# Altium integrated library My_LIB.IntLib: 372 symbols (part 3 of 3)
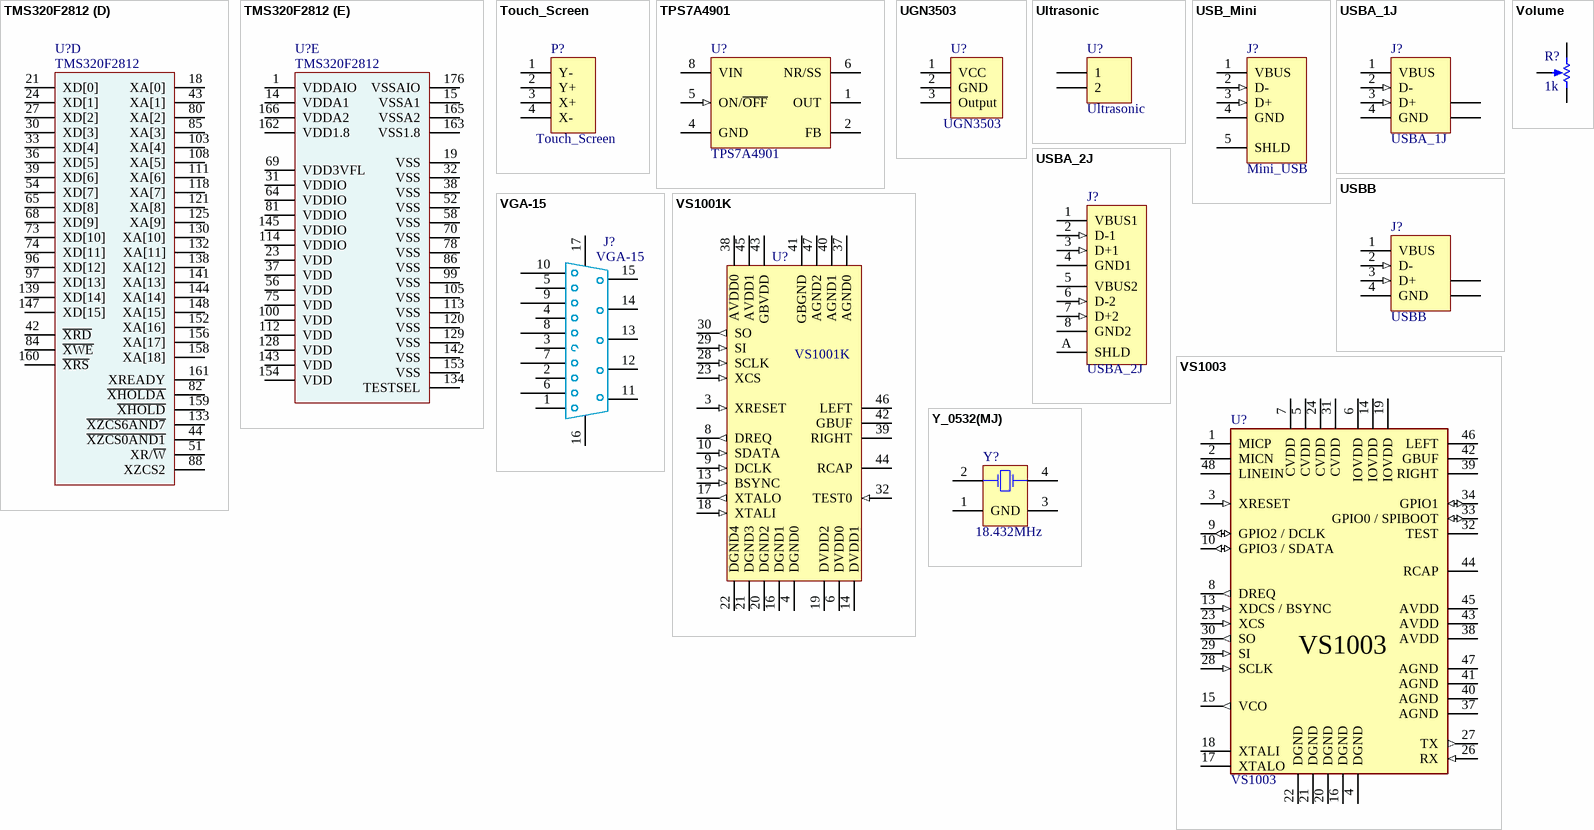
[diagram p15: symbols TMS320F2812 to Y_0532(MJ)]

## TMS320F2812
designator U?
footprint LQFP176_M (Thin QFP, 176-Leads, Body 24x24mm, Pitch 0.5mm, IPC Low Density)
footprint LQFP176_N (Thin QFP, 176-Leads, Body 24x24mm, Pitch 0.5mm, IPC Medium Density)
footprint LQFP176_L (Thin QFP, 176-Leads, Body 24x24mm, Pitch 0.5mm, IPC High Density)
part A pins: 2 ADCINB0, 3 ADCINB1, 4 ADCINB2, 5 ADCINB3, 6 ADCINB4, 7 ADCINB5, 8 ADCINB6, 9 ADCINB7, 10 ADCREFM, 11 ADCREFP, 12 AVSSREFBG, 13 AVDDREFBG, 16 ADCRESEXT, 17 XMP/~{MC}, 66 NC (TEST2), 67 NC (TEST1), 76 X2, 77 X1/XCLKIN, 119 XCLKOUT, 126 TMS, 127 TDO, 131 TDI, 135 ~{TRST}, 136 TCK, 137 EMU0, 146 EMU1, 164 ADCBGREFIN, 167 ADCINA7, 168 ADCINA6, 169 ADCINA5, 170 ADCINA4, 171 ADCINA3, 172 ADCINA2, 173 ADCINA1, 174 ADCINA0, 175 ADCLO
part B pins: 45 GPIOB0/PWM7, 46 GPIOB1/PWM8, 47 GPIOB2/PWM9, 48 GPIOB3/PWM10, 49 GPIOB4/PWM11, 50 GPIOB5/PWM12, 53 GPIOB6/T3PWM_T3CMP, 55 GPIOB7/T4PWM_T4CMP, 57 GPIOB8/CAP4_QEP3, 59 GPIOB9/CAP5_QEP4, 60 GPIOB10/CAP6_QEPI2, 61 GPIOB13/~{C4TRIP}, 62 GPIOB14/~{C5TRIP}, 63 GPIOB15/~{C6TRIP}, 71 GPIOB11/TDIRB, 72 GPIOB12/TCLKINB, 92 GPIOA0/PWM1, 93 GPIOA1/PWM2, 94 GPIOA2/PWM3, 95 GPIOA3/PWM4, 98 GPIOA4/PWM5, 101 GPIOA5/PWM6, 102 GPIOA6/T1PWM_T1CMP, 104 GPIOA7/T2PWM_T2CMP, 106 GPIOA8/CAP1_QEP1, 107 GPIOA9/CAP1_QEP2, 109 GPIOA10/CAP3_QEPI1, 116 GPIOA11/TDIRA, 117 GPIOA12/TCLKINA, 122 GPIOA13/~{C1TRIP}, 123 GPIOA14/~{C2TRIP}, 124 GPIOA15/~{C3TRIP}
part C pins: 20 GPIOF13/MDRA, 22 GPIOF12/MDXA, 25 GPIOF9/MCLKRA, 26 GPIOF10/MFSXA, 28 GPIOF8/MCLKXA, 29 GPIOF11/MFSRA, 34 GPIOF2/SPICLKA, 35 GPIOF3/SPISTEA, 40 GPIOF0/SPISIMOA, 41 GPIOF1/SPISOMIA, 79 GPIOD5/~{T3CTRIP_PDPINTB}, 83 GPIOD6/~{T4CTRIP/EVBSOC}, 87 GPIOF6/CANTXA, 89 GPIOF7/CANRXA, 90 GPIOG4/SCITXDB, 91 GPIOG5/SCIRXDB, 110 GPIOD0/~{T1CTRIP_PDPINTA}, 115 GPIOD1/~{T2CTRIP}/~{EVASOC}, 140 GPIOF14/XF_~{XPLLDIS}, 149 GPIOE0/XINT1_XBIO, 150 GPIOE2/XNMI_XINT13, 151 GPIOE1/XINT2_ADCSOC, 155 GPIOF4/SCITXDA, 157 GPIOF5/SCIRXDA
part D pins: 18 XA[0], 21 XD[0], 24 XD[1], 27 XD[2], 30 XD[3], 33 XD[4], 36 XD[5], 39 XD[6], 42 ~{XRD}, 43 XA[1], 44 ~{XZCS0AND1}, 51 XR/~{W}, 54 XD[7], 65 XD[8], 68 XD[9], 73 XD[10], 74 XD[11], 80 XA[2], 82 ~{XHOLDA}, 84 ~{XWE}, 85 XA[3], 88 XZCS2, 96 XD[12], 97 XD[13], 103 XA[4], 108 XA[5], 111 XA[6], 118 XA[7], 121 XA[8], 125 XA[9], 130 XA[10], 132 XA[11], 133 ~{XZCS6AND7}, 138 XA[12], 139 XD[14], 141 XA[13], 144 XA[14], 147 XD[15], 148 XA[15], 152 XA[16], 156 XA[17], 158 XA[18], 159 ~{XHOLD}, 160 ~{XRS}, 161 XREADY
part E pins: 1 VDDAIO, 14 VDDA1, 15 VSSA1, 19 VSS, 23 VDD, 31 VDDIO, 32 VSS, 37 VDD, 38 VSS, 52 VSS, 56 VDD, 58 VSS, 64 VDDIO, 69 VDD3VFL, 70 VSS, 75 VDD, 78 VSS, 81 VDDIO, 86 VSS, 99 VSS, 100 VDD, 105 VSS, 112 VDD, 113 VSS, 114 VDDIO, 120 VSS, 128 VDD, 129 VSS, 134 TESTSEL, 142 VSS, 143 VDD, 145 VDDIO, 153 VSS, 154 VDD, 162 VDD1.8, 163 VSS1.8, 165 VSSA2, 166 VDDA2, 176 VSSAIO

## Touch_Screen
designator P?
PartNumber: LM386N-1; Manufacturer: National Semiconductor; CompType: Audio IC; PackageTopMarking: NSUZXYTT*LM*386N-1; Published: 27-Nov-2008; DatasheetVersion: Aug-2000; PackageVersion: revG, May-2006; PackageReference: N08E; PackageDescription: MDIP, .365 x .250 x .130in, 8 Lead, .100in Pitch; RoHS: O; PinCount: 8; DigiKeyPartNumber: LM386N-1-ND; Code_JEDEC: MS-001-BA; ComponentLink1Description: LM386 Datasheet; ComponentLink1URL: http://www.national.com/ds/LM/LM386.pdf; ComponentLink2Description: LM386 Web Page; ComponentLink2URL: http://www.national.com/pf/LM/LM386.html; ComponentLink3Description: N08E Package Page; ComponentLink3URL: http://www.national.com/packaging/folders/n08e.html
footprint Touch-Screen_Connector
pins: 1 Y- (power), 2 Y+, 3 X+, 4 X-

## TPS7A4901
designator U?
Ultra low noise linear power supply
footprint MSOP-8
pins: 1 OUT, 2 FB, 4 GND (power), 5 ON/~{OFF} (in), 6 NR/SS "Noise reduction pin", 8 VIN (power)

## UGN3503
designator U?
PartNumber: LM386N-1; Manufacturer: National Semiconductor; CompType: Audio IC; PackageTopMarking: NSUZXYTT*LM*386N-1; Published: 27-Nov-2008; DatasheetVersion: Aug-2000; PackageVersion: revG, May-2006; PackageReference: N08E; PackageDescription: MDIP, .365 x .250 x .130in, 8 Lead, .100in Pitch; RoHS: O; PinCount: 8; DigiKeyPartNumber: LM386N-1-ND; Code_JEDEC: MS-001-BA; ComponentLink1Description: LM386 Datasheet; ComponentLink1URL: http://www.national.com/ds/LM/LM386.pdf; ComponentLink2Description: LM386 Web Page; ComponentLink2URL: http://www.national.com/pf/LM/LM386.html; ComponentLink3Description: N08E Package Page; ComponentLink3URL: http://www.national.com/packaging/folders/n08e.html
footprint TO-92
pins: 1 VCC (power), 2 GND, 3 Output

## Ultrasonic
designator U?
footprint Ultrasonic
pins: 1, 2

## USB_Mini
designator J?, comment Mini_USB
USB 2.0, Right Angle, SMT, B Type, Receptacle, 5 Position, Black; ContactMaterial: Copper Alloy; ContactPlating: Gold (30); PCB_Layout: Complies with manufacturer's recommendation.; DrillSize: Corresponds to nominal value.; PanelGround: Without; Published: 15-Jul-2004; DatasheetDocument: 27-Jun-2003; PackageDocument: 27-Jun-2003; PackageReference: 440247; Publisher: Altium Limited; HousingMaterial: Thermoplastic; ComponentLink1Description: Manufacturer Link; ComponentLink1URL: http://www.tycoelectronics.com/; ComponentLink2Description: Packaging Specification; ComponentLink2URL: http://ecommas.tycoelectronics.com/commerce/DocumentDelivery/DDEController?Action=showdoc&DocId=Customer+Drawing%7F440247%7FD%7Fpdf%7FEnglish%7FC_440247_D.pdf
footprint USB_mini
pins: 1 VBUS (power) "Power", 2 D- (in) "-DATA", 3 D+ (in) "+DATA", 4 GND (power) "Ground", 5 SHLD "Shield"

## USBA_1J
designator J?
USB 1.1, Right Angle, Thru-Hole, Reverse Type, Receptacle, 4 Position, Black; ContactMaterial: Copper Alloy; ContactPlating: Gold Flash; TerminationLength: 2.40mm [0.094in.]; PCB_Layout: Complies with manufacturer's recommendation.; DrillSize: Corresponds to nominal value.; PanelGround: Without; Published: 15-Jul-2004; DatasheetDocument: 18-Mar-2004; PackageDocument: 18-Mar-2004; PackageReference: 440068; Publisher: Altium Limited; HousingMaterial: Glass-Filled Thermoplastic; ComponentLink1Description: Manufacturer Link; ComponentLink1URL: http://www.tycoelectronics.com/; ComponentLink2Description: Packaging Specification; ComponentLink2URL: http://ecommas.tycoelectronics.com/commerce/DocumentDelivery/DDEController?Action=showdoc&DocId=Customer+Drawing%7F440068%7FD%7Ftif%7FEnglish%7FC_440068_D.tif
footprint USBA_1J (Connector; USB1.1, Reverse Type, Thru-Hole; 4 Position; Right Angle)
pins: 1 VBUS (power) "Power", 2 D- (in) "-DATA", 3 D+ (in) "+DATA", 4 GND (power) "Ground", 5 SHLD "Shield", 6 SHLD "Shield"

## USBA_2J
designator J?
USB 1.1, Right Angle, Thru-Hole, Reverse Type, Receptacle, 4 Position, Black; ContactMaterial: Copper Alloy; ContactPlating: Gold Flash; TerminationLength: 2.40mm [0.094in.]; PCB_Layout: Complies with manufacturer's recommendation.; DrillSize: Corresponds to nominal value.; PanelGround: Without; Published: 15-Jul-2004; DatasheetDocument: 18-Mar-2004; PackageDocument: 18-Mar-2004; PackageReference: 440068; Publisher: Altium Limited; HousingMaterial: Glass-Filled Thermoplastic; ComponentLink1Description: Manufacturer Link; ComponentLink1URL: http://www.tycoelectronics.com/; ComponentLink2Description: Packaging Specification; ComponentLink2URL: http://ecommas.tycoelectronics.com/commerce/DocumentDelivery/DDEController?Action=showdoc&DocId=Customer+Drawing%7F440068%7FD%7Ftif%7FEnglish%7FC_440068_D.tif
footprint USBA-2J (Dual port USB connector)
pins: 1 VBUS1 (power) "Power", 2 D-1 (in) "-DATA", 3 D+1 (in) "+DATA", 4 GND1 (power) "Ground", 5 VBUS2 (power) "Power", 6 D-2 (in) "-DATA", 7 D+2 (in) "+DATA", 8 GND2 (power) "Ground", A SHLD (power) "Ground"

## USBB
designator J?
USB 1.1, Right Angle, Thru-Hole, Reverse Type, Receptacle, 4 Position, Black; ContactMaterial: Copper Alloy; ContactPlating: Gold Flash; TerminationLength: 2.40mm [0.094in.]; PCB_Layout: Complies with manufacturer's recommendation.; DrillSize: Corresponds to nominal value.; PanelGround: Without; Published: 15-Jul-2004; DatasheetDocument: 18-Mar-2004; PackageDocument: 18-Mar-2004; PackageReference: 440068; Publisher: Altium Limited; HousingMaterial: Glass-Filled Thermoplastic; ComponentLink1Description: Manufacturer Link; ComponentLink1URL: http://www.tycoelectronics.com/; ComponentLink2Description: Packaging Specification; ComponentLink2URL: http://ecommas.tycoelectronics.com/commerce/DocumentDelivery/DDEController?Action=showdoc&DocId=Customer+Drawing%7F440068%7FD%7Ftif%7FEnglish%7FC_440068_D.tif
footprint USB
pins: 1 VBUS (power) "Power", 2 D- (in) "-DATA", 3 D+ (in) "+DATA", 4 GND (power) "Ground", 5 SHLD "Shield", 6 SHLD "Shield"

## VGA-15
designator J?
footprint VGA-15-F
footprint VGA-15-M
pins: 1, 2, 3, 4, 5, 6, 7, 8, 9, 10, 11, 12, 13, 14, 15, 16, 17

## Volume
designator R?, comment 1k
Potentiometer
footprint Volume
pins: 1 TOP, 2 TAP, 3 BOT

## VS1001K
designator U?
Mp3 decoder
footprint LQFP48_M (Thin QFP, 48-Leads, Body 7x7mm, Pitch 0.5mm, IPC Low Density)
pins: 3 XRESET (in), 4 DGND0 (power), 6 DVDD0 (power), 8 DREQ (out), 9 DCLK (in), 10 SDATA (in), 13 BSYNC (in), 14 DVDD1 (power), 16 DGND1 (power), 17 XTALO (out), 18 XTALI (in), 19 DVDD2 (power), 20 DGND2 (power), 21 DGND3 (power), 22 DGND4 (power), 23 XCS (in), 28 SCLK (in), 29 SI (in), 30 SO (out), 32 TEST0 (in), 37 AGND0 (power), 38 AVDD0 (power), 39 RIGHT, 40 AGND1 (power), 41 GBGND (power), 42 GBUF, 43 GBVDD (power), 44 RCAP, 45 AVDD1 (power), 46 LEFT, 47 AGND2 (power)

## VS1003
designator U?
MP3 Decoder
footprint LQFP48_M (Thin QFP, 48-Leads, Body 7x7mm, Pitch 0.5mm, IPC Low Density)
footprint LQFP48_M-DIL-Main (Thin QFP, 48-Leads, Body 7x7mm, Pitch 0.5mm, IPC Low Density)
footprint LQFP48_M-DIL-Slave (Thin QFP, 48-Leads, Body 7x7mm, Pitch 0.5mm, IPC Low Density)
pins: 1 MICP, 2 MICN, 3 XRESET (in), 4 DGND (power), 5 CVDD (power), 6 IOVDD (power), 7 CVDD (power), 8 DREQ (out), 9 GPIO2 / DCLK (io), 10 GPIO3 / SDATA (io), 13 XDCS / BSYNC (in), 14 IOVDD (power), 15 VCO (out), 16 DGND (power), 17 XTALO, 18 XTALI, 19 IOVDD (power), 20 DGND (power), 21 DGND (power), 22 DGND (power), 23 XCS (in), 24 CVDD (power), 26 RX (in), 27 TX (out), 28 SCLK (in), 29 SI (in), 30 SO (out), 31 CVDD (power), 32 TEST, 33 GPIO0 / SPIBOOT (io), 34 GPIO1 (io), 37 AGND (power), 38 AVDD (power), 39 RIGHT, 40 AGND (power), 41 AGND (power), 42 GBUF, 43 AVDD (power), 44 RCAP, 45 AVDD (power), 46 LEFT, 47 AGND (power), 48 LINEIN

## Y_0532(MJ)
designator Y?, comment 18.432MHz
Crystal Oscillator; Value: 18.432MHz
footprint 0532(MJ) (Surface Mount Quartz Crystal; Body 5.0 x 3.2 mm (LxW))
pins: 1 GND, 2 OSC1, 3 GND, 4 OSC2